# Altium integrated library Cap-Cer-SMD_V2.IntLib: 957 symbols (part 4 of 7)
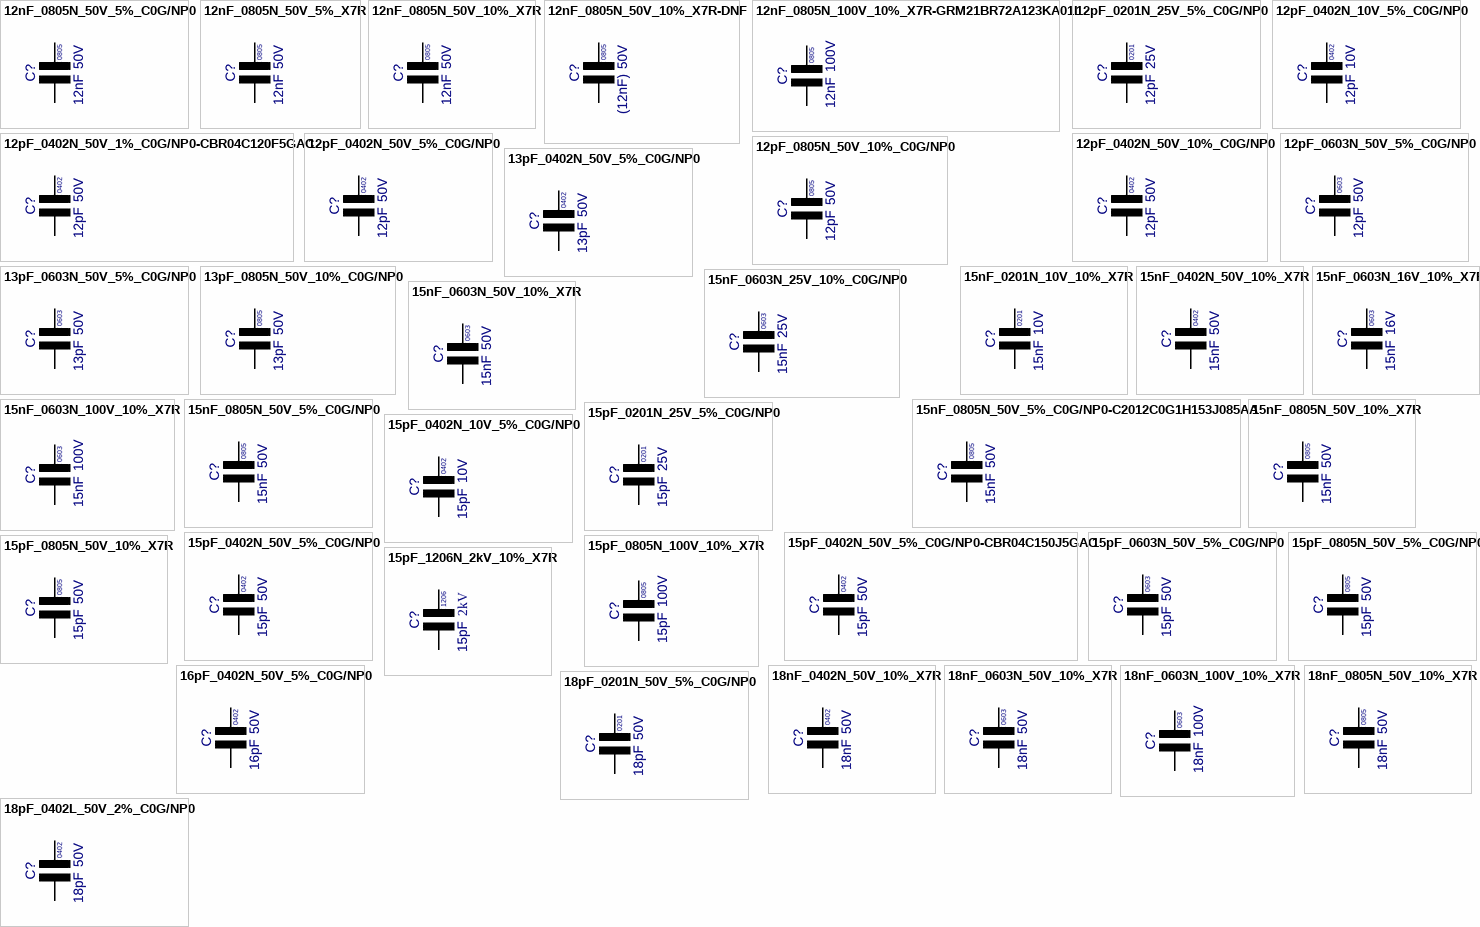
[diagram p26: symbols 12nF_0805N_50V_5%_C0G/NP0 to 18pF_0402L_50V_2%_C0G/NP0]

## 12pF_0201N_25V_5%_C0G/NP0
designator C?, comment value 12pF  Voltage: 25V  Text1: 0201  (hidden comment: 12pF_C0201_25V_5%_C0G/NP0)
Cap Ceramic C0G/NP0; Manufacturer: Various; Part Number: 12pF 0201 25V 5%_C0G/NP0; Tol: 5%; Package: CAPC0201X33N; EDM-PN: *; Text2: *; SAAB PN: *; DCE Part No: *
footprint CAPC0201X33N (Chip Capacitor, 0201, 2-Leads, Body 0.6x0.3mm, IPC Medium Density)
pins: 1, 2

## 12pF_0402N_10V_5%_C0G/NP0
designator C?, comment value 12pF  Voltage: 10V  Text1: 0402  (hidden comment: 12pF_C0402_10V_5%_C0G/NP0)
Cap Ceramic C0G/NP0; Manufacturer: Various; Part Number: 12pF 0402 10V 5% C0G/NP0; EDM-PN: CAP930; Tol: 5%; Package: CAPC0402X60N; Text2: *; SAAB PN: *; DCE Part No: *
footprint CAPC0402X60N (Chip Capacitor, 0402, 2-Leads, Body 1.0x0.5mm, IPC Medium Density)
pins: 1, 2

## 12pF_0402N_50V_1%_C0G/NP0-CBR04C120F5GAC
designator C?, comment value 12pF  Voltage: 50V  Text1: 0402  (hidden comment: CBR04C120F5GAC)
Cap Ceramic C0G/NP0 HiQ-CBR Series for RF; Manufacturer: Kemet; EDM-PN: CAP1402; Tol: 1%; Part Number: CBR04C120F5GAC; Package: CAPC0402X60N; Text2: *; SAAB PN: *; DCE Part No: *
footprint CAPC0402X60N (Chip Capacitor, 0402, 2-Leads, Body 1.0x0.5mm, IPC Medium Density)
pins: 1, 2

## 12pF_0402N_50V_5%_C0G/NP0
designator C?, comment value 12pF  Voltage: 50V  Text1: 0402  (hidden comment: 12pF_C0402_50V_5%_C0G/NP0)
Cap Ceramic C0G/NP0; Manufacturer: Various; Part Number: 12pF 0402 50V 5% C0G/NP0; EDM-PN: CAP845; Tol: 5%; Package: CAPC0402X60N; Text2: *; SAAB PN: *; DCE Part No: *
footprint CAPC0402X60N (Chip Capacitor, 0402, 2-Leads, Body 1.0x0.5mm, IPC Medium Density)
pins: 1, 2

## 12pF_0402N_50V_10%_C0G/NP0
designator C?, comment value 12pF  Voltage: 50V  Text1: 0402  (hidden comment: 12pF_C0402_50V_10%_C0G/NP0)
Cap Ceramic C0G/NP0; Manufacturer: Various; Part Number: 12pF 0402 50V 10% C0G/NP0; DCE Part No: 7601; Tol: 10%; Package: CAPC0402X60N; EDM-PN: *; Text2: *; SAAB PN: *
footprint CAPC0402X60N (Chip Capacitor, 0402, 2-Leads, Body 1.0x0.5mm, IPC Medium Density)
pins: 1, 2

## 12pF_0603N_50V_5%_C0G/NP0
designator C?, comment value 12pF  Voltage: 50V  Text1: 0603  (hidden comment: 12pF_C0603_50V_5%_C0G/NP0)
Cap Ceramic C0G/NP0; Manufacturer: Various; Part Number: 12pF 0603 50V 5% C0G/NP0; Tol: 5%; Package: CAPC0603X85N; EDM-PN: *; Text2: *; SAAB PN: *; DCE Part No: *
footprint CAPC0603X85N (Chip Capacitor, 0603, 2-Leads, Body 1.6x0.8mm, IPC Medium Density)
pins: 1, 2

## 12pF_0805N_50V_10%_C0G/NP0
designator C?, comment value 12pF  Voltage: 50V  Text1: 0805  (hidden comment: 12pF_C0805_50V_10%_C0G/NP0)
Cap Ceramic C0G/NP0; Manufacturer: Various; Part Number: 12pF 0805 50V 10% C0G/NP0; EDM-PN: CAP13; Tol: 0.5pF; Package: CAPC0805X110N; Text2: *; SAAB PN: *; DCE Part No: *
footprint CAPC0805X110N (Chip Capacitor, 0805, 2-Leads, Body 2.0x1.3mm, IPC Medium Density)
pins: 1, 2

## 13pF_0402N_50V_5%_C0G/NP0
designator C?, comment value 13pF  Voltage: 50V  Text1: 0402  (hidden comment: 13pF_C0402_50V_5%_C0G/NP0)
Cap Ceramic C0G/NP0; Manufacturer: Various; Part Number: 13pF 0402 50V 5% C0G/NP0; Tol: 5%; Package: CAPC0402X60N; EDM-PN: *; Text2: *; SAAB PN: *; DCE Part No: *
footprint CAPC0402X60N (Chip Capacitor, 0402, 2-Leads, Body 1.0x0.5mm, IPC Medium Density)
pins: 1, 2

## 13pF_0603N_50V_5%_C0G/NP0
designator C?, comment value 13pF  Voltage: 50V  Text1: 0603  (hidden comment: 13pF_C0603_50V_5%_C0G/NP0)
Cap Ceramic C0G/NP0; Manufacturer: Various; Part Number: 13pF 0603 50V 5% C0G/NP0; Tol: 5%; Package: CAPC0603X85N; EDM-PN: *; Text2: *; SAAB PN: *; DCE Part No: *
footprint CAPC0603X85N (Chip Capacitor, 0603, 2-Leads, Body 1.6x0.8mm, IPC Medium Density)
pins: 1, 2

## 13pF_0805N_50V_10%_C0G/NP0
designator C?, comment value 13pF  Voltage: 50V  Text1: 0805  (hidden comment: 13pF_C0805_50V_10%_C0G/NP0)
Cap Ceramic C0G/NP0; Manufacturer: Various; Part Number: 13pF 0805 50V 10% C0G/NP0; Tol: 0.5pF; Package: CAPC0805X110N; EDM-PN: *; Text2: *; SAAB PN: *; DCE Part No: *
footprint CAPC0805X110N (Chip Capacitor, 0805, 2-Leads, Body 2.0x1.3mm, IPC Medium Density)
pins: 1, 2

## 15nF_0201N_10V_10%_X7R
designator C?, comment value 15nF  Voltage: 10V  Text1: 0201  (hidden comment: 15nF_C0201_10V_10%_X7R)
Cap Ceramic X7R; Manufacturer: Various; Part Number: 15nF 0201 10V 10% X7R; Tol: 10%; Package: CAPC0201X33N; EDM-PN: *; Text2: *; SAAB PN: *; DCE Part No: *
footprint CAPC0201X33N (Chip Capacitor, 0201, 2-Leads, Body 0.6x0.3mm, IPC Medium Density)
pins: 1, 2

## 15nF_0402N_50V_10%_X7R
designator C?, comment value 15nF  Voltage: 50V  Text1: 0402  (hidden comment: 15nF_C0402_50V_10%_X7R)
Cap Ceramic X7R; Manufacturer: Various; Part Number: 15nF 0402 50V 10% X7R; EDM-PN: CAP1030; Tol: 10%; Package: CAPC0402X60N; Text2: *; SAAB PN: *; DCE Part No: *
footprint CAPC0402X60N (Chip Capacitor, 0402, 2-Leads, Body 1.0x0.5mm, IPC Medium Density)
pins: 1, 2

## 15nF_0603N_16V_10%_X7R
designator C?, comment value 15nF  Voltage: 16V  Text1: 0603  (hidden comment: 15nF_C0603_16V_10%_X7R)
Cap Ceramic X7R; Manufacturer: Various; Part Number: 15nF 0603 16V 10% X7R; Tol: 10%; Package: CAPC0603X85N; EDM-PN: *; Text2: *; SAAB PN: *; DCE Part No: *
footprint CAPC0603X85N (Chip Capacitor, 0603, 2-Leads, Body 1.6x0.8mm, IPC Medium Density)
pins: 1, 2

## 15nF_0603N_25V_10%_C0G/NP0
designator C?, comment value 15nF  Voltage: 25V  Text1: 0603  (hidden comment: 15nF_C0603_25V_10%_C0G/NP0)
Cap Ceramic C0G/NP0; Manufacturer: Various; Part Number: 15nF 0603 25V 10% C0G/NP0; Tol: 10%; Package: CAPC0603X85N; EDM-PN: *; Text2: *; SAAB PN: *; DCE Part No: *
footprint CAPC0603X85N (Chip Capacitor, 0603, 2-Leads, Body 1.6x0.8mm, IPC Medium Density)
pins: 1, 2

## 15nF_0603N_50V_10%_X7R
designator C?, comment value 15nF  Voltage: 50V  Text1: 0603  (hidden comment: 15nF_C0603_50V_10%_X7R)
Cap Ceramic X7R; Manufacturer: Various; Part Number: 15nF 0603 50V 10% X7R; Tol: 10%; Package: CAPC0603X85N; EDM-PN: *; Text2: *; SAAB PN: *; DCE Part No: *
footprint CAPC0603X85N (Chip Capacitor, 0603, 2-Leads, Body 1.6x0.8mm, IPC Medium Density)
pins: 1, 2

## 15nF_0603N_100V_10%_X7R
designator C?, comment value 15nF  Voltage: 100V  Text1: 0603  (hidden comment: 15nF_C0603_100V_10%_X7R)
Cap Ceramic X7R; Manufacturer: Various; Part Number: 15nF 0603 100V 10% X7R; Tol: 10%; Reutech PN: 5910-CA-0487; Package: CAPC0603X85N; EDM-PN: *; Text2: *; SAAB PN: *; DCE Part No: *
footprint CAPC0603X85N (Chip Capacitor, 0603, 2-Leads, Body 1.6x0.8mm, IPC Medium Density)
pins: 1, 2

## 15nF_0805N_50V_5%_C0G/NP0
designator C?, comment value 15nF  Voltage: 50V  Text1: 0805  (hidden comment: 15nF_C0805_50V_5%_C0G/NP0)
Cap Ceramic C0G/NP0; Manufacturer: Various; Part Number: 15nF 0805 50V 5% C0G/NP0; Tol: 5%; Package: CAPC0805X110N; EDM-PN: *; Text2: *; SAAB PN: *; DCE Part No: *
footprint CAPC0805X110N (Chip Capacitor, 0805, 2-Leads, Body 2.0x1.3mm, IPC Medium Density)
pins: 1, 2

## 15nF_0805N_50V_5%_C0G/NP0-C2012C0G1H153J085AA
designator C?, comment value 15nF  Voltage: 50V  Text1: 0805  (hidden comment: C2012C0G1H153J085AA)
Cap Ceramic C0G/NP0 Low ESL; Manufacturer: TDK; Tol: 5%; Part Number: C2012C0G1H153J085AA; Package: CAPC0805X110N; EDM-PN: *; Text2: *; Reutech PN: *; SAAB PN: *; DCE Part No: *
footprint CAPC0805X110N (Chip Capacitor, 0805, 2-Leads, Body 2.0x1.3mm, IPC Medium Density)
pins: 1, 2

## 15nF_0805N_50V_10%_X7R
designator C?, comment value 15nF  Voltage: 50V  Text1: 0805  (hidden comment: 15nF_C0805_50V_10%_X7R)
Cap Ceramic X7R; Manufacturer: Various; Part Number: 15nF 0805 50V 10% X7R; Tol: 10%; Package: CAPC0805X110N; EDM-PN: *; Text2: *; SAAB PN: *; DCE Part No: *
footprint CAPC0805X110N (Chip Capacitor, 0805, 2-Leads, Body 2.0x1.3mm, IPC Medium Density)
pins: 1, 2

## 15pF_0201N_25V_5%_C0G/NP0
designator C?, comment value 15pF  Voltage: 25V  Text1: 0201  (hidden comment: 15pF_C0201_25V_5%_C0G/NP0)
Cap Ceramic C0G/NP0; Manufacturer: Various; Part Number: 15pF 0201 25V 5%_C0G/NP0; Tol: 5%; Package: CAPC0201X33N; EDM-PN: *; Text2: *; SAAB PN: *; DCE Part No: *
footprint CAPC0201X33N (Chip Capacitor, 0201, 2-Leads, Body 0.6x0.3mm, IPC Medium Density)
pins: 1, 2

## 15pF_0402N_10V_5%_C0G/NP0
designator C?, comment value 15pF  Voltage: 10V  Text1: 0402  (hidden comment: 15pF_C0402_10V_5%_C0G/NP0)
Cap Ceramic C0G/NP0; Manufacturer: Various; Part Number: 15pF 0402 10V 5% C0G/NP0; Tol: 5%; Package: CAPC0402X60N; EDM-PN: *; Text2: *; SAAB PN: *; DCE Part No: *
footprint CAPC0402X60N (Chip Capacitor, 0402, 2-Leads, Body 1.0x0.5mm, IPC Medium Density)
pins: 1, 2

## 15pF_0402N_50V_5%_C0G/NP0
designator C?  value 15pF  Voltage: 50V  Text1: 0402  (hidden comment: 15pF_0402N_50V_5%_C0G/NP0)
Cap Ceramic C0G(NP0); Manufacturer: Various; Part Number: 15pF 0402 50V 5% C0G/NP0; EDM-PN: CAP331; Tol: 5%; Reutech PN: 5910-CA-0552; Package: CAPC0402X60N; Text2: *; SAAB PN: *; DCE Part No: *
footprint CAPC0402X60N (Chip Capacitor, 0402, 2-Leads, Body 1.0x0.5mm, IPC Medium Density)
pins: 1, 2

## 15pF_0402N_50V_5%_C0G/NP0-CBR04C150J5GAC
designator C?, comment value 15pF  Voltage: 50V  Text1: 0402  (hidden comment: CBR04C150J5GAC)
Cap Ceramic C0G/NP0 HiQ-CBR Series for RF; Manufacturer: Kemet; EDM-PN: CAP1425; Tol: 5%; Part Number: CBR04C150J5GAC; Package: CAPC0402X60N; Text2: *; SAAB PN: *; DCE Part No: *
footprint CAPC0402X60N (Chip Capacitor, 0402, 2-Leads, Body 1.0x0.5mm, IPC Medium Density)
pins: 1, 2

## 15pF_0603N_50V_5%_C0G/NP0
designator C?, comment value 15pF  Voltage: 50V  Text1: 0603  (hidden comment: 15pF_C0603_50V_5%_NP0)
Cap Ceramic C0G/NP0; Manufacturer: Various; Part Number: 15pF 0603 50V 5% C0G/NP0; EDM-PN: CAP350; Tol: 5%; Package: CAPC0603X85N; Text2: *; SAAB PN: *; DCE Part No: *
footprint CAPC0603X85N (Chip Capacitor, 0603, 2-Leads, Body 1.6x0.8mm, IPC Medium Density)
pins: 1, 2

## 15pF_0805N_50V_5%_C0G/NP0
designator C?, comment value 15pF  Voltage: 50V  Text1: 0805  (hidden comment: 15pF_C0805_50V_5%_C0G/NP0)
Cap Ceramic C0G/NP0; Manufacturer: Various; Part Number: 15pF 0805 50V 5% C0G/NP0; Tol: 5%; Package: CAPC0805X110N; EDM-PN: *; Text2: *; SAAB PN: *; DCE Part No: *
footprint CAPC0805X110N (Chip Capacitor, 0805, 2-Leads, Body 2.0x1.3mm, IPC Medium Density)
pins: 1, 2

## 15pF_0805N_50V_10%_X7R
designator C?, comment value 15pF  Voltage: 50V  Text1: 0805  (hidden comment: 15pF_C0805_50V_10%_X7R)
Cap Ceramic X7R; Manufacturer: Various; Part Number: 15pF 0805 50V 10% X7R; Tol: 10%; Package: CAPC0805X110N; EDM-PN: *; Text2: *; SAAB PN: *; DCE Part No: *
footprint CAPC0805X110N (Chip Capacitor, 0805, 2-Leads, Body 2.0x1.3mm, IPC Medium Density)
pins: 1, 2

## 15pF_0805N_100V_10%_X7R
designator C?, comment value 15pF  Voltage: 100V  Text1: 0805  (hidden comment: 15pF_C0805_100V_10%_X7R)
Cap Ceramic X7R; Manufacturer: Various; Part Number: 15pF 0805 100V 10% X7R; Tol: 10%; Package: CAPC0805X110N; EDM-PN: *; Text2: *; SAAB PN: *; DCE Part No: *
footprint CAPC0805X110N (Chip Capacitor, 0805, 2-Leads, Body 2.0x1.3mm, IPC Medium Density)
pins: 1, 2

## 15pF_1206N_2kV_10%_X7R
designator C?, comment value 15pF  Voltage: 2kV  Text1: 1206  (hidden comment: 15pF_C1206_2kV_10%_X7R)
Cap Ceramic X7R; Manufacturer: Various; Part Number: 15pF 1206 2KV 10% X7R; Tol: 10%; Package: CAPC1206X135N; EDM-PN: *; Text2: *; SAAB PN: *; DCE Part No: *
footprint CAPC1206X135N (Chip Capacitor, 1206, 2-Leads, Body 3.2x1.6mm, IPC Medium Density)
pins: 1, 2

## 16pF_0402N_50V_5%_C0G/NP0
designator C?, comment value 16pF  Voltage: 50V  Text1: 0402  (hidden comment: 16pF_C0402_50V_5%_C0G/NP0)
Cap Ceramic C0G/NP0; Manufacturer: Various; Part Number: 16pF 0402 50V 5% C0G/NP0; Tol: 5%; Package: CAPC0402X60N; EDM-PN: *; Text2: *; SAAB PN: *; DCE Part No: *
footprint CAPC0402X60N (Chip Capacitor, 0402, 2-Leads, Body 1.0x0.5mm, IPC Medium Density)
pins: 1, 2

## 18nF_0402N_50V_10%_X7R
designator C?, comment value 18nF  Voltage: 50V  Text1: 0402  (hidden comment: 18nF_C0402_50V_10%_X7R)
Cap Ceramic X7R; Manufacturer: Various; Part Number: 18nF 0402 50V 10% X7R; Tol: 10%; Package: CAPC0402X60N; EDM-PN: *; Text2: *; SAAB PN: *; DCE Part No: *
footprint CAPC0402X60N (Chip Capacitor, 0402, 2-Leads, Body 1.0x0.5mm, IPC Medium Density)
pins: 1, 2

## 18nF_0603N_50V_10%_X7R
designator C?, comment value 18nF  Voltage: 50V  Text1: 0603  (hidden comment: 18nF_C0603_50V_10%_X7R)
Cap Ceramic X7R; Manufacturer: Various; Part Number: 18nF 0603 50V 10% X7R; Tol: 10%; Package: CAPC0603X85N; EDM-PN: *; Text2: *; SAAB PN: *; DCE Part No: *
footprint CAPC0603X85N (Chip Capacitor, 0603, 2-Leads, Body 1.6x0.8mm, IPC Medium Density)
pins: 1, 2

## 18nF_0603N_100V_10%_X7R
designator C?, comment value 18nF  Voltage: 100V  Text1: 0603  (hidden comment: 18nF_C0603_100V_10%_X7R)
Cap Ceramic X7R; Manufacturer: Various; Part Number: 18nF 0603 100V 10% X7R; Tol: 10%; Package: CAPC0603X85N; EDM-PN: *; Text2: *; SAAB PN: *; DCE Part No: *
footprint CAPC0603X85N (Chip Capacitor, 0603, 2-Leads, Body 1.6x0.8mm, IPC Medium Density)
pins: 1, 2

## 18nF_0805N_50V_10%_X7R
designator C?, comment value 18nF  Voltage: 50V  Text1: 0805  (hidden comment: 18nF_C0805_50V_10%_X7R)
Cap Ceramic X7R; Manufacturer: Various; Part Number: 18nF 0805 50V 10% X7R; Tol: 10%; Package: CAPC0805X110N; EDM-PN: *; Text2: *; SAAB PN: *; DCE Part No: *
footprint CAPC0805X110N (Chip Capacitor, 0805, 2-Leads, Body 2.0x1.3mm, IPC Medium Density)
pins: 1, 2

## 18pF_0201N_50V_5%_C0G/NP0
designator C?, comment value 18pF  Voltage: 50V  Text1: 0201  (hidden comment: 18pF_C0201_50V_5%_C0G)
Cap Ceramic C0G; Manufacturer: Various; Part Number: 18pF 0201 50V 5%_C0G; Tol: 5%; Package: CAPC0201X33N; EDM-PN: *; Text2: *; SAAB PN: *; DCE Part No: *
footprint CAPC0201X33N (Chip Capacitor, 0201, 2-Leads, Body 0.6x0.3mm, IPC Medium Density)
pins: 1, 2

## 18pF_0402L_50V_2%_C0G/NP0
designator C?, comment value 18pF  Voltage: 50V  Text1: 0402  (hidden comment: 18pF_C0402_50V_2%_C0G/NP0)
Cap Ceramic C0G/NP0; Manufacturer: Various; Part Number: 18pF 0402 50V 2% C0G/NP0; Tol: 2%; Package: CAPC0402X60L; EDM-PN: *; Text2: *; SAAB PN: *; DCE Part No: *
footprint CAPC0402X60L (Chip Capacitor, 0402, 2-Leads, Body 1.0x0.5mm, IPC High Density)
pins: 1, 2

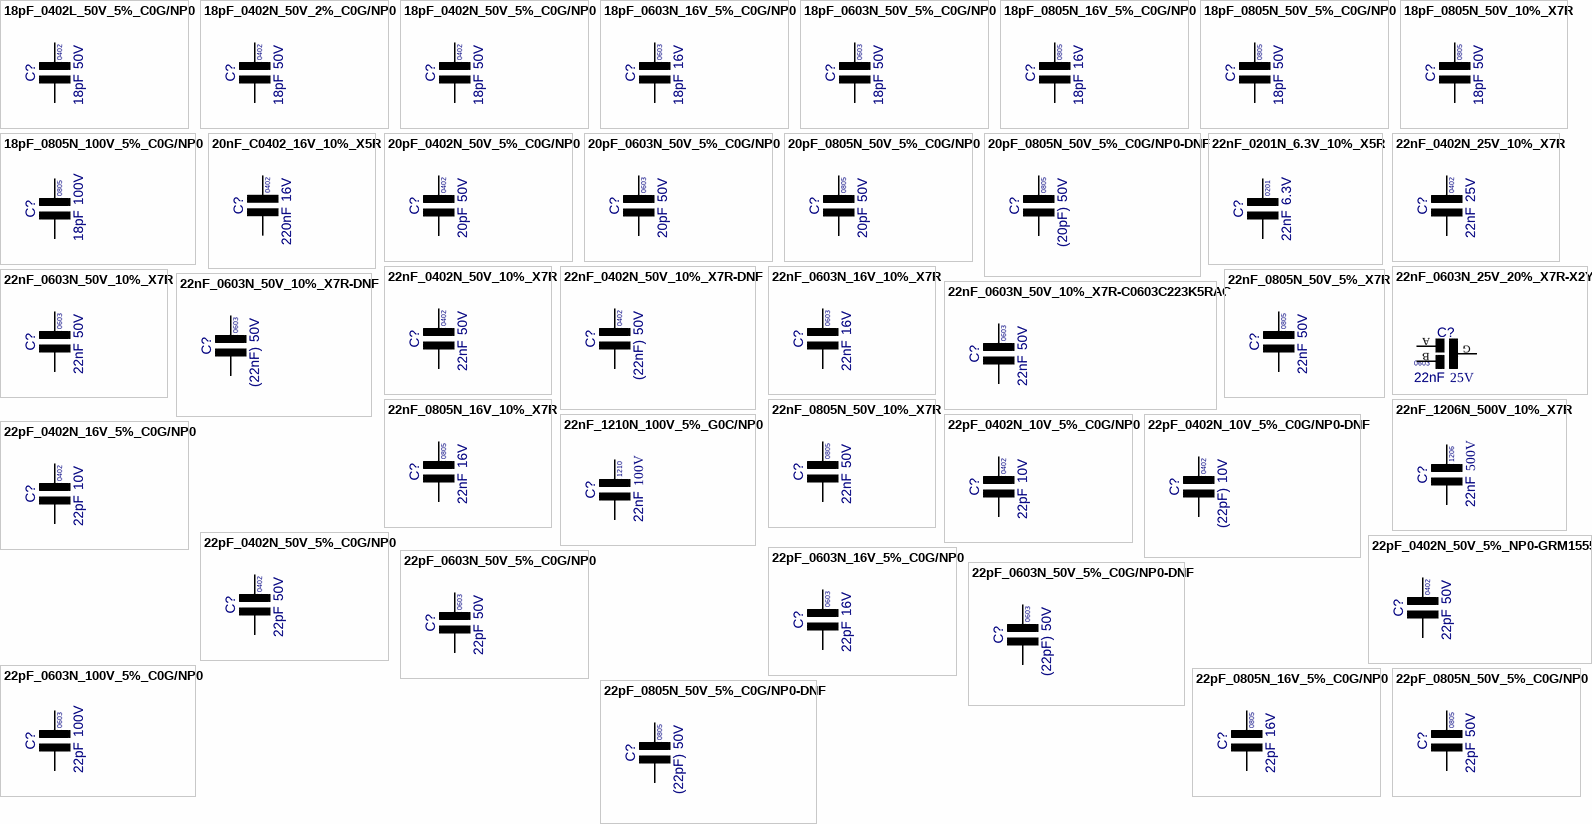
[diagram p12: symbols 18pF_0402L_50V_5%_C0G/NP0 to 22pF_0805N_50V_5%_C0G/NP0-DNF]

## 18pF_0402L_50V_5%_C0G/NP0
designator C?, comment value 18pF  Voltage: 50V  Text1: 0402  (hidden comment: 18pF_C0402_50V_5%_C0G/NP0)
Cap Ceramic C0G/NP0; Manufacturer: Various; Part Number: 18pF 0402 50V 5% C0G/NP0; Tol: 5%; Package: CAPC0402X60L; EDM-PN: *; Text2: *; SAAB PN: *; DCE Part No: *
footprint CAPC0402X60L (Chip Capacitor, 0402, 2-Leads, Body 1.0x0.5mm, IPC High Density)
pins: 1, 2

## 18pF_0402N_50V_2%_C0G/NP0
designator C?, comment value 18pF  Voltage: 50V  Text1: 0402  (hidden comment: 18pF_C0402_50V_2%_C0G/NP0)
Cap Ceramic C0G/NP0; Manufacturer: Various; Part Number: 18pF 0402 50V 2% C0G/NP0; Tol: 2%; Package: CAPC0402X60N; EDM-PN: *; Text2: *; SAAB PN: *; DCE Part No: *
footprint CAPC0402X60N (Chip Capacitor, 0402, 2-Leads, Body 1.0x0.5mm, IPC Medium Density)
pins: 1, 2

## 18pF_0402N_50V_5%_C0G/NP0
designator C?, comment value 18pF  Voltage: 50V  Text1: 0402  (hidden comment: 18pF_C0402_50V_5%_C0G/NP0)
Cap Ceramic C0G/NP0; Manufacturer: Various; Part Number: 18pF 0402 50V 5% C0G/NP0; Tol: 5%; Package: CAPC0402X60N; EDM-PN: *; Text2: *; SAAB PN: *; DCE Part No: *
footprint CAPC0402X60N (Chip Capacitor, 0402, 2-Leads, Body 1.0x0.5mm, IPC Medium Density)
pins: 1, 2

## 18pF_0603N_16V_5%_C0G/NP0
designator C?, comment value 18pF  Voltage: 16V  Text1: 0603  (hidden comment: 18pF_C0603_16V_5%_C0G/NP0)
Cap Ceramic C0G/NP0; Manufacturer: Various; Part Number: 18pF 0603 16V 5% C0G/NP0; Tol: 5%; Package: CAPC0603X85N; EDM-PN: *; Text2: *; SAAB PN: *; DCE Part No: *
footprint CAPC0603X85N (Chip Capacitor, 0603, 2-Leads, Body 1.6x0.8mm, IPC Medium Density)
pins: 1, 2

## 18pF_0603N_50V_5%_C0G/NP0
designator C?, comment value 18pF  Voltage: 50V  Text1: 0603  (hidden comment: 18pF_C0603_50V_5%_C0G/NP0)
Cap Ceramic C0G/NP0; Manufacturer: Various; Part Number: 18pF 0603 50V 5% C0G/NP0; EDM-PN: CAP848; Tol: 5%; Package: CAPC0603X85N; Text2: *; SAAB PN: *; DCE Part No: *
footprint CAPC0603X85N (Chip Capacitor, 0603, 2-Leads, Body 1.6x0.8mm, IPC Medium Density)
pins: 1, 2

## 18pF_0805N_16V_5%_C0G/NP0
designator C?, comment value 18pF  Voltage: 16V  Text1: 0805  (hidden comment: 18pF_C0805_16V_5%_C0G/NP0)
Cap Ceramic C0G/NP0; Manufacturer: Various; Part Number: 18pF 0805 16V 5% C0G/NP0; Tol: 5%; Package: CAPC0805X110N; EDM-PN: *; Text2: *; SAAB PN: *; DCE Part No: *
footprint CAPC0805X110N (Chip Capacitor, 0805, 2-Leads, Body 2.0x1.3mm, IPC Medium Density)
pins: 1, 2

## 18pF_0805N_50V_5%_C0G/NP0
designator C?, comment value 18pF  Voltage: 50V  Text1: 0805  (hidden comment: 18pF_C0805_50V_5%_C0G/NP0)
Cap Ceramic C0G/NP0; Manufacturer: Various; Part Number: 18pF 0805 50V 5% C0G/NP0; EDM-PN: CAP9; Tol: 5%; Package: CAPC0805X110N; Text2: *; SAAB PN: *; DCE Part No: *
footprint CAPC0805X110N (Chip Capacitor, 0805, 2-Leads, Body 2.0x1.3mm, IPC Medium Density)
pins: 1, 2

## 18pF_0805N_50V_10%_X7R
designator C?, comment value 18pF  Voltage: 50V  Text1: 0805  (hidden comment: 18pF_C0805_50V_10%_X7R)
Cap Ceramic X7R; Manufacturer: Various; Part Number: 18pF 0805 50V 10% X7R; Tol: 10%; Package: CAPC0805X110N; EDM-PN: *; Text2: *; SAAB PN: *; DCE Part No: *
footprint CAPC0805X110N (Chip Capacitor, 0805, 2-Leads, Body 2.0x1.3mm, IPC Medium Density)
pins: 1, 2

## 18pF_0805N_100V_5%_C0G/NP0
designator C?, comment value 18pF  Voltage: 100V  Text1: 0805  (hidden comment: 18pF_C0805_100V_5%_C0G/NP0)
Cap Ceramic C0G/NP0; Manufacturer: Various; Part Number: 18pF 0805 100V 5% C0G/NP0; Tol: 5%; Package: CAPC0805X110N; EDM-PN: *; Text2: *; SAAB PN: *; DCE Part No: *
footprint CAPC0805X110N (Chip Capacitor, 0805, 2-Leads, Body 2.0x1.3mm, IPC Medium Density)
pins: 1, 2

## 20nF_C0402_16V_10%_X5R
designator C?, comment value 220nF  Voltage: 16V  Text1: 0402  (hidden comment: 220nF_C0402_16V_10%_X5R)
Cap Ceramic X5R; Manufacturer: Various; Part Number: 20nF C0402 16V 10% X5R; Tol: 10%; Package: CAPC0402X60N; EDM-PN: *; Text2: *; SAAB PN: *; DCE Part No: *
footprint CAPC0402X60N (Chip Capacitor, 0402, 2-Leads, Body 1.0x0.5mm, IPC Medium Density)
pins: 1, 2

## 20pF_0402N_50V_5%_C0G/NP0
designator C?, comment value 20pF  Voltage: 50V  Text1: 0402  (hidden comment: 20pF_C0402_50V_5%_C0G/NP0)
Cap Ceramic C0G/NP0; Manufacturer: Various; Part Number: 20pF 0402 50V 5% C0G/NP0; Tol: 5%; Package: CAPC0402X60N; EDM-PN: *; Text2: *; SAAB PN: *; DCE Part No: *
footprint CAPC0402X60N (Chip Capacitor, 0402, 2-Leads, Body 1.0x0.5mm, IPC Medium Density)
pins: 1, 2

## 20pF_0603N_50V_5%_C0G/NP0
designator C?, comment value 20pF  Voltage: 50V  Text1: 0603  (hidden comment: 20pF_C0603_50V_5%_C0G/NP0)
Cap Ceramic C0G/NP0; Manufacturer: Various; Part Number: 20pF 0603 50V 5% C0G/NP0; EDM-PN: CAP613; Tol: 5%; Package: CAPC0603X85N; Text2: *; SAAB PN: *; DCE Part No: *
footprint CAPC0603X85N (Chip Capacitor, 0603, 2-Leads, Body 1.6x0.8mm, IPC Medium Density)
pins: 1, 2

## 20pF_0805N_50V_5%_C0G/NP0
designator C?, comment value 20pF  Voltage: 50V  Text1: 0805  (hidden comment: 20pF_C0805_50V_5%_C0G/NP0)
Cap Ceramic C0G/NP0; Manufacturer: Various; Part Number: 20pF 0805 50V 5% C0G/NP0; Tol: 5%; Package: CAPC0805X110N; EDM-PN: *; Text2: *; SAAB PN: *; DCE Part No: *
footprint CAPC0805X110N (Chip Capacitor, 0805, 2-Leads, Body 2.0x1.3mm, IPC Medium Density)
pins: 1, 2

## 20pF_0805N_50V_5%_C0G/NP0-DNF
designator C?, comment value (20pF)  Voltage: 50V  Text1: 0805  (hidden comment: 20pF_C0805_50V_5%_C0G/NP0)
Cap Ceramic C0G/NP0 - Do not Fit; Manufacturer: Various; Part Number: DNF - 20pF 0805 50V 5% C0G/NP0; Tol: 5%; Package: CAPC0805X110N; EDM-PN: *; Text2: *; SAAB PN: *; DCE Part No: *
footprint CAPC0805X110N (Chip Capacitor, 0805, 2-Leads, Body 2.0x1.3mm, IPC Medium Density)
pins: 1, 2

## 22nF_0201N_6.3V_10%_X5R
designator C?, comment value 22nF  Voltage: 6.3V  Text1: 0201  (hidden comment: 22nF_C0201_6.3V_10%_X5R)
Cap Ceramic X5R; Manufacturer: Various; Part Number: 22nF 0201 25V 10% X5R; Tol: 10%; Package: CAPC0201X33N; EDM-PN: *; Text2: *; SAAB PN: *; DCE Part No: *
footprint CAPC0201X33N (Chip Capacitor, 0201, 2-Leads, Body 0.6x0.3mm, IPC Medium Density)
pins: 1, 2

## 22nF_0402N_25V_10%_X7R
designator C?  value 22nF  Voltage: 25V  Text1: 0402  (hidden comment: 22nF_0402N_25V_10%_X7R)
Cap Ceramic X7R; Manufacturer: Various; Part Number: 22nF C0402 25V 10% X7R; Tol: 10%; Package: CAPC0402X60N; EDM-PN: *; Text2: *; SAAB PN: *; DCE Part No: *
footprint CAPC0402X60N (Chip Capacitor, 0402, 2-Leads, Body 1.0x0.5mm, IPC Medium Density)
pins: 1, 2

## 22nF_0402N_50V_10%_X7R
designator C?  value 22nF  Voltage: 50V  Text1: 0402  (hidden comment: 22nF_0402N_50V_10%_X7R)
Cap Ceramic X7R; Manufacturer: Various; Part Number: 22nF C0402 50V 10% X7R; DCE Part No: 9073; EDM-PN: CAP820; Tol: 10%; SAAB PN: 1AAB00485AEA; Package: CAPC0402X60N; Text2: *
footprint CAPC0402X60N (Chip Capacitor, 0402, 2-Leads, Body 1.0x0.5mm, IPC Medium Density)
pins: 1, 2

## 22nF_0402N_50V_10%_X7R-DNF
designator C?  value (22nF)  Voltage: 50V  Text1: 0402  (hidden comment: 22nF_0402N_50V_10%_X7R-DNF)
Cap Ceramic X7R - Do not Fit; Manufacturer: Various; Part Number: DNF - 22nF C0402 50V 10% X7R; Tol: 10%; Package: CAPC0402X60N; EDM-PN: *; Text2: *; SAAB PN: *; DCE Part No: *
footprint CAPC0402X60N (Chip Capacitor, 0402, 2-Leads, Body 1.0x0.5mm, IPC Medium Density)
pins: 1, 2

## 22nF_0603N_16V_10%_X7R
designator C?, comment value 22nF  Voltage: 16V  Text1: 0603  (hidden comment: 22nF_C0603_16V_10%_X7R)
Cap Ceramic X7R; Manufacturer: Various; Part Number: 22nF 0603 16V 10% X7R; Tol: 10%; Package: CAPC0603X85N; EDM-PN: *; Text2: *; Reutech PN: *; SAAB PN: *; DCE Part No: *
footprint CAPC0603X85N (Chip Capacitor, 0603, 2-Leads, Body 1.6x0.8mm, IPC Medium Density)
pins: 1, 2

## 22nF_0603N_25V_20%_X7R-X2Y
designator C?, comment value 22nF  Voltage: 25V  Text1: 0603  (hidden comment: X2Y-22nF_C0603_25V_20%_X7R)
Cap Ceramic X2Y; Manufacturer: Johanson; Part Number: 250X14W223MV4T; Tol: 20%; Package: CAPC0603-X2Y; EDM-PN: *; Text2: *; SAAB PN: *; DCE Part No: *
footprint CAPC0603-X2Y (Cap 0603 X2Y 1.6x0.89mm)
pins: A, B, G

## 22nF_0603N_50V_10%_X7R
designator C?, comment value 22nF  Voltage: 50V  Text1: 0603  (hidden comment: 22nF_C0603_50V_10%_X7R)
Cap Ceramic X7R; Manufacturer: Various; Part Number: 22nF 0603 50V 10% X7R; EDM-PN: CAP1236; Tol: 10%; Reutech PN: 5910-CA-0474; Package: CAPC0603X85N; Text2: *; SAAB PN: *; DCE Part No: *
footprint CAPC0603X85N (Chip Capacitor, 0603, 2-Leads, Body 1.6x0.8mm, IPC Medium Density)
pins: 1, 2

## 22nF_0603N_50V_10%_X7R-C0603C223K5RAC
designator C?, comment value 22nF  Voltage: 50V  Text1: 0603  (hidden comment: C0603C223K5RAC)
Cap Ceramic X7R; Manufacturer: Kemet; Tol: 10%; Reutech PN: 5910-CA-0565; Part Number: C0603C223K5RAC; Package: CAPC0603X85N; EDM-PN: *; Text2: *; SAAB PN: *; DCE Part No: *
footprint CAPC0603X85N (Chip Capacitor, 0603, 2-Leads, Body 1.6x0.8mm, IPC Medium Density)
pins: 1, 2

## 22nF_0603N_50V_10%_X7R-DNF
designator C?, comment value (22nF)  Voltage: 50V  Text1: 0603  (hidden comment: 22nF_C0603_50V_10%_X7R-DNF)
Cap Ceramic X7R - Do not Fit; Manufacturer: Various; Part Number: DNF - 22nF 0603 50V 10% X7R; EDM-PN: CAP1236; Tol: 10%; Reutech PN: 5910-CA-0474; Package: CAPC0603X85N; Text2: *; SAAB PN: *; DCE Part No: *
footprint CAPC0603X85N (Chip Capacitor, 0603, 2-Leads, Body 1.6x0.8mm, IPC Medium Density)
pins: 1, 2

## 22nF_0805N_16V_10%_X7R
designator C?, comment value 22nF  Voltage: 16V  Text1: 0805  (hidden comment: 22nF_C0805_16V_10%_X7R)
Cap Ceramic X7R; Manufacturer: Various; Part Number: 22nF 0805 16V 10% X7R; Tol: 10%; Package: CAPC0805X110N; EDM-PN: *; Text2: *; SAAB PN: *; DCE Part No: *
footprint CAPC0805X110N (Chip Capacitor, 0805, 2-Leads, Body 2.0x1.3mm, IPC Medium Density)
pins: 1, 2

## 22nF_0805N_50V_5%_X7R
designator C?, comment value 22nF  Voltage: 50V  Text1: 0805  (hidden comment: 22nF_C0805_50V_5%_X7R)
Cap Ceramic X7R; Manufacturer: Various; Part Number: 22nF 0805 50V 5% X7R; Tol: 5%; Package: CAPC0805X110N; EDM-PN: *; Text2: *; SAAB PN: *; DCE Part No: *
footprint CAPC0805X110N (Chip Capacitor, 0805, 2-Leads, Body 2.0x1.3mm, IPC Medium Density)
pins: 1, 2

## 22nF_0805N_50V_10%_X7R
designator C?, comment value 22nF  Voltage: 50V  Text1: 0805  (hidden comment: 22nF_C0805_50V_10%_X7R)
Cap Ceramic X7R; Manufacturer: Various; Part Number: 22nF 0805 50V 10% X7R; Tol: 10%; Package: CAPC0805X110N; EDM-PN: *; Text2: *; SAAB PN: *; DCE Part No: *
footprint CAPC0805X110N (Chip Capacitor, 0805, 2-Leads, Body 2.0x1.3mm, IPC Medium Density)
pins: 1, 2

## 22nF_1206N_500V_10%_X7R
designator C?, comment value 22nF  Voltage: 500V  Text1: 1206  (hidden comment: 22nF_C1206_500V_10%_X7R)
Cap Ceramic X7R; Manufacturer: Various; Part Number: 22nF 1206N 500V 10% X7R; Tol: 10%; Package: CAPC1206X178N; EDM-PN: *; Text2: *; SAAB PN: *; DCE Part No: *
footprint CAPC1206X178N (Chip Capacitor, 1206, 2-Leads, Body 3.2x1.6mm, IPC Medium Density)
pins: 1, 2

## 22nF_1210N_100V_5%_G0C/NP0
designator C?, comment value 22nF  Voltage: 100V  Text1: 1210  (hidden comment: 22nF_C1210_100V_5%_G0C/NP0)
Cap Ceramic G0C/NP0; Manufacturer: Various; Part Number: 22nF 1210 100V 5% G0C/NP0; Tol: 5%; Reutech PN: 5910-CA-0553; Package: CAPC1210X135N; EDM-PN: *; Text2: *; SAAB PN: *; DCE Part No: *
footprint CAPC1210X135N (Chip Capacitor, 1210, 2-Leads, Body 3.2x2.5mm, IPC Medium Density)
pins: 1, 2

## 22pF_0402N_10V_5%_C0G/NP0
designator C?, comment value 22pF  Voltage: 10V  Text1: 0402  (hidden comment: 22pF_C0402_10V_5%_C0G/NP0)
Cap Ceramic C0G/NP0; Manufacturer: Various; Part Number: 22pF 0402 10V 5% C0G/NP0; Tol: 5%; Package: CAPC0402X60N; EDM-PN: *; Text2: *; SAAB PN: *; DCE Part No: *
footprint CAPC0402X60N (Chip Capacitor, 0402, 2-Leads, Body 1.0x0.5mm, IPC Medium Density)
pins: 1, 2

## 22pF_0402N_10V_5%_C0G/NP0-DNF
designator C?, comment value (22pF)  Voltage: 10V  Text1: 0402  (hidden comment: 22pF_C0402_10V_5%_C0G/NP0-DNF)
Cap Ceramic C0G - Do not Fit; Manufacturer: Various; Part Number: DNF - 22pF 0402 10V 5% C0G/NP0; Tol: 5%; Package: CAPC0402X60N; EDM-PN: *; Text2: *; SAAB PN: *; DCE Part No: *
footprint CAPC0402X60N (Chip Capacitor, 0402, 2-Leads, Body 1.0x0.5mm, IPC Medium Density)
pins: 1, 2

## 22pF_0402N_16V_5%_C0G/NP0
designator C?, comment value 22pF  Voltage: 10V  Text1: 0402  (hidden comment: 22pF_C0402_16V_5%_C0G/NP0)
Cap Ceramic C0G/NP0; Manufacturer: Various; Part Number: 22pF 0402 16V 5% C0G/NP0; EDM-PN: CAP601; Tol: 5%; Package: CAPC0402X60N; Text2: *; SAAB PN: *; DCE Part No: *
footprint CAPC0402X60N (Chip Capacitor, 0402, 2-Leads, Body 1.0x0.5mm, IPC Medium Density)
pins: 1, 2

## 22pF_0402N_50V_5%_C0G/NP0
designator C?, comment value 22pF  Voltage: 50V  Text1: 0402  (hidden comment: 22pF_C0402_50V_5%_C0G/NP0)
Cap Ceramic C0G/NP0; Manufacturer: Various; Part Number: 22pF 0402 50V 5% C0G/NP0; Tol: 5%; Package: CAPC0402X60N; EDM-PN: *; Text2: *; SAAB PN: *; DCE Part No: *
footprint CAPC0402X60N (Chip Capacitor, 0402, 2-Leads, Body 1.0x0.5mm, IPC Medium Density)
pins: 1, 2

## 22pF_0402N_50V_5%_NP0-GRM1555C
designator C?, comment value 22pF  Voltage: 50V  Text1: 0402  (hidden comment: 22pF_C0402_50V_5%_NP0)
Cap Ceramic NP0; Manufacturer: Murata; Part Number: GRM1555C1H220JA01J; Tol: 5%; Package: GRM155-0.20; EDM-PN: *; Text2: *; SAAB PN: *; DCE Part No: *
footprint GRM155-0.20 (GRM155 0402 1.0x0.5mm)
pins: 1, 2

## 22pF_0603N_16V_5%_C0G/NP0
designator C?, comment value 22pF  Voltage: 16V  Text1: 0603  (hidden comment: 22pF_C0603_16V_5%_C0G/NP0)
Cap Ceramic C0G/NP0; Manufacturer: Various; Part Number: 22pF 0603 16V 5% C0G/NP0; Tol: 5%; Package: CAPC0603X85N; EDM-PN: *; Text2: *; SAAB PN: *; DCE Part No: *
footprint CAPC0603X85N (Chip Capacitor, 0603, 2-Leads, Body 1.6x0.8mm, IPC Medium Density)
pins: 1, 2

## 22pF_0603N_50V_5%_C0G/NP0
designator C?, comment value 22pF  Voltage: 50V  Text1: 0603  (hidden comment: 22pF_C0603_50V_5%_C0G/NP0)
Cap Ceramic C0G/NP0; Manufacturer: Various; Part Number: 22pF 0603 50V 5% C0G/NP0; EDM-PN: CAP691; Tol: 5%; Package: CAPC0603X85N; Text2: *; SAAB PN: *; DCE Part No: *
footprint CAPC0603X85N (Chip Capacitor, 0603, 2-Leads, Body 1.6x0.8mm, IPC Medium Density)
pins: 1, 2

## 22pF_0603N_50V_5%_C0G/NP0-DNF
designator C?, comment value (22pF)  Voltage: 50V  Text1: 0603  (hidden comment: 22pF_C0603_50V_5%_C0G/NP0-DNF)
Cap Ceramic C0G/NP0 - Do not Fit; Manufacturer: Various; Part Number: DNF - 22pF 0603 50V 5% C0G/NP0; EDM-PN: CAP352; Tol: 5%; Package: CAPC0603X85N; Text2: *; SAAB PN: *; DCE Part No: *
footprint CAPC0603X85N (Chip Capacitor, 0603, 2-Leads, Body 1.6x0.8mm, IPC Medium Density)
pins: 1, 2

## 22pF_0603N_100V_5%_C0G/NP0
designator C?, comment value 22pF  Voltage: 100V  Text1: 0603  (hidden comment: 22pF_C0603_100V_5%_C0G/NP0)
Cap Ceramic C0G/NP0; Manufacturer: Various; Part Number: 22pF 0603 100V 5% C0G/NP0; Tol: 5%; Package: CAPC0603X85N; EDM-PN: *; Text2: *; SAAB PN: *; DCE Part No: *
footprint CAPC0603X85N (Chip Capacitor, 0603, 2-Leads, Body 1.6x0.8mm, IPC Medium Density)
pins: 1, 2

## 22pF_0805N_16V_5%_C0G/NP0
designator C?, comment value 22pF  Voltage: 16V  Text1: 0805  (hidden comment: 22pF_C0805_16V_5%_C0G/NP0)
Cap Ceramic C0G/NP0; Manufacturer: Various; Part Number: 22pF 0805 16V 5% C0G/NP0; Tol: 5%; Package: CAPC0805X110N; EDM-PN: *; Text2: *; SAAB PN: *; DCE Part No: *
footprint CAPC0805X110N (Chip Capacitor, 0805, 2-Leads, Body 2.0x1.3mm, IPC Medium Density)
pins: 1, 2

## 22pF_0805N_50V_5%_C0G/NP0
designator C?, comment value 22pF  Voltage: 50V  Text1: 0805  (hidden comment: 22pF_C0805_50V_5%_C0G/NP0)
Cap Ceramic C0G/NP0; Manufacturer: Various; Part Number: 22pF 0805 50V 5% C0G/NP0; Tol: 5%; Package: CAPC0805X110N; EDM-PN: *; Text2: *; SAAB PN: *; DCE Part No: *
footprint CAPC0805X110N (Chip Capacitor, 0805, 2-Leads, Body 2.0x1.3mm, IPC Medium Density)
pins: 1, 2
